# Altium footprint library lib.PcbLib: 145 footprints (part 2 of 10)
Each footprint in its own frame and in the unit in brackets; x right, y up, seen from the top. Pads: shape width x height; smd on the part's side, far side on the other; paste and mask are expansions set on the pad; w line width, h text height; cw(c..) or ccw(c..) is an arc to the next point about the centre after c.
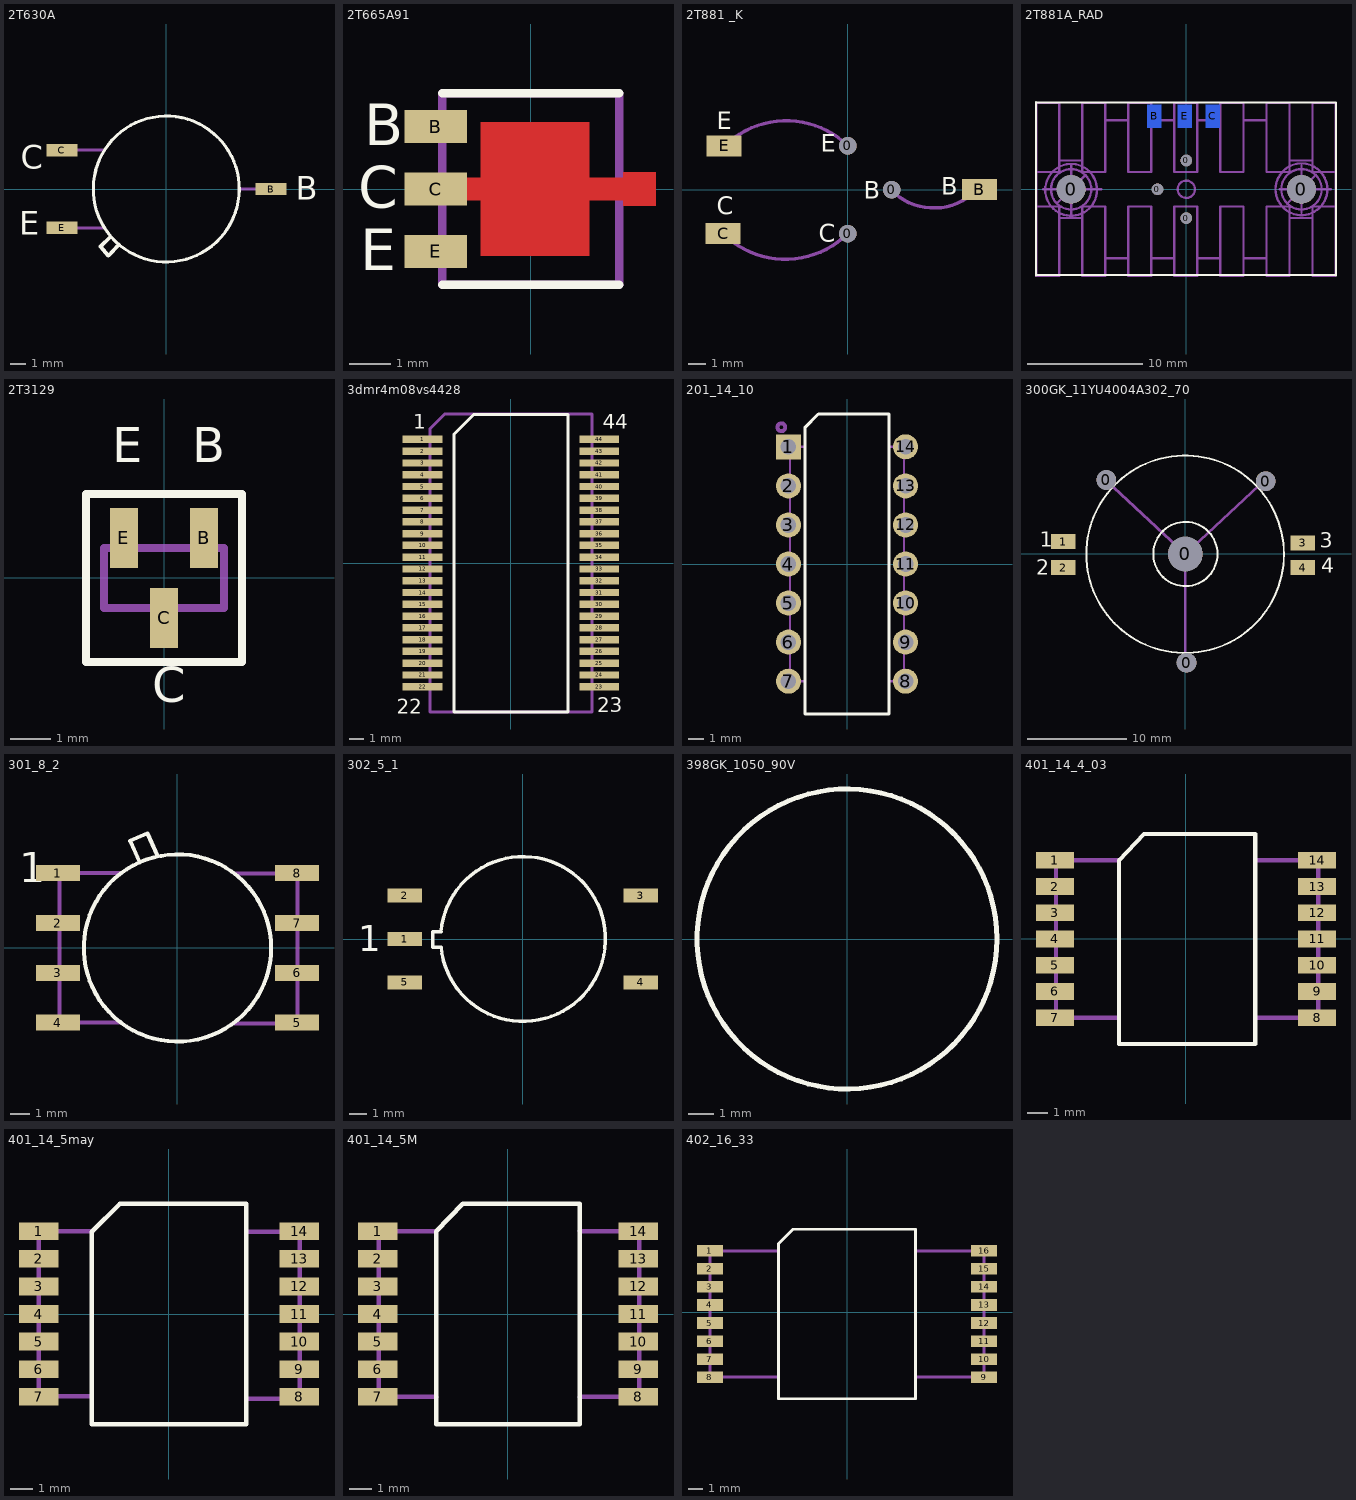
[diagram p1: the footprints below, top view; thin cyan lines are the x and y axes]

## 2T630A [mm]
height 9.6
pads (3):
  rect 2x0.8 smd: B(6.737,0) C(-6.737,2.5) E(-6.737,-2.5)
Top Overlay:
  lines w0.2: -3.586,-3.053 cw(c-0.012,0) -3.556,-3.087
  lines w0.254: -3.621,-3.103 -4.25,-3.7 -3.75,-4.3 -3.079,-3.596
  text "C" at -9.4,1.3 h1.5
  text "E" at -9.5,-2.95 h1.5
  text "B" at 8.325,-0.7 h1.5
Mechanical 5:
  lines w0.2: -7.25,-2.5 -4,-2.5 ; -7.25,2.5 -4,2.5 ; 4.75,0 7.25,0
Mechanical 25:
  text "B" at 5,1 h2
  text "C" at -5.25,3 h2
  text "E" at -5.5,-4.25 h2

## 2T665A91 [mm] "корпус 4601.3-1"
height 1.7
pads (3):
  rect 1.5x0.8 smd: B(-2.28,1.5) C(-2.28,0) E(-2.28,-1.5)
Top Layer:
  region: -1.2,-1.6 1.4,-1.6 1.4,1.6 -1.2,1.6
  region: 0.87,-0.275 2.22,-0.28 2.22,-0.4 3,-0.4 3,0.4 2.22,0.4 2.22,0.275 0.87,0.275
  region: -2.63,-0.275 -0.93,-0.275 -0.93,0.275 -2.63,0.275
Top Overlay:
  lines w0.2: -2.13,-2.3 2.12,-2.3 ; -2.13,2.3 2.12,2.3
  text "C" at -4.15,-0.45 h1
  text "B" at -4,1.05 h1
  text "E" at -4.1,-1.95 h1
Top Paste:
  region: -1.15,-1.55 1.35,-1.55 1.35,1.55 -1.15,1.55
  region: 0.87,-0.275 2.22,-0.28 2.225,-0.35 2.95,-0.35 2.95,0.35 2.225,0.35 2.22,0.275 0.87,0.275
  region: -2.575,-0.225 -0.95,-0.225 -0.95,0.225 -2.575,0.225
Top Solder:
  region: 0.35,-1.675 1.45,-1.675 1.45,-0.375 2.1,-0.375 2.1,-0.475 3.05,-0.475 3.05,0.475 2.1,0.475 2.1,0.375 1.45,0.375 1.45,1.675 -1.3,1.675 -1.3,0.375 -1.6,0.375 -1.6,0.325 -1.6,-0.375 -1.3,-0.375 -1.3,-1.675
Mechanical 5:
  lines w0.2: -2.13,-2.3 2.12,-2.3 2.12,2.3 -2.13,2.3 -2.13,-2.3
Mechanical 25:
  text "E" at -4.05,-2 h2
  text "B" at -4.1,1 h2
  text "C" at -4.25,-0.5 h2
3D body: height 0.44, standoff 0, extent 2.1,-0.4 2.7,0.4
3D body: height 0.44, standoff 0, extent -2.7,1.1 -2.1,1.9
3D body: height 0.44, standoff 0, extent -2.7,-0.4 -2.1,0.4
3D body: height 0.44, standoff 0, extent -2.7,-1.9 -2.1,-1.1
3D body: height 1.7, standoff 0, extent -2.1,-2.3 2.1,2.3

## 2T881 _K [mm]
height 7
pads (6):
  round 1 hole 1 unplated: 0(0,-2.5) 0(0,2.5) 0(2.5,0)
  rect 2x1.2 smd: B(7.5,0) C(-7.1,-2.5) E(-7.05,2.5)
Top Overlay:
  text "B" at 0.9,-0.525 h1
  text "C" at -1.65,-2.975 h1
  text "E" at -1.55,2.15 h1
  text "E" at -7.45,3.45 h1
  text "B" at 5.325,-0.3 h1
  text "C" at -7.475,-1.4 h1
Bottom Overlay:
  circle w0.2: c0,0 r4.7
  lines w0.2: -4.268,2.371 -5.056,3.081 -4.347,3.869 -3.558,3.159
Mechanical 5:
  circle w0.2: c2.5,0 r0.27
  circle w0.2: c0,-2.5 r0.27
  circle w0.2: c0,2.5 r0.27
  lines w0.2: -7.125,-2.475 ccw(c-3.55,1.075) 0,-2.5 ; -7.025,2.475 cw(c-3.5,-1.05) 0.025,2.475 ; 2.475,-0.025 ccw(c4.9,2.35) 7.275,-0.075
Mechanical 25:
  text "C" at -7.525,-1.7 h2
  text "B" at 5.35,-0.45 h2
  text "E" at -7.8,3.25 h2
3D body: height 0.8, standoff 0, extent -4.975,2.3 -3.5,3.8
3D body: height 0, standoff -7, extent -0.496,2.001 0.5,2.999
3D body: height 0, standoff -7, extent 2.004,-0.499 3,0.499
3D body: height 0, standoff -7, extent -0.496,-2.999 0.5,-2.001
3D body: height 6.3, standoff 0.8, extent -4,-3.997 4,3.997
3D body: height 0.7, standoff 0, extent -4.7,-4.697 4.7,4.697

## 2T881A_RAD [mm]
height 10
pads (8):
  round 2.5 hole 2.5 unplated: 0(-10,0) 0(10,0)
  round 1 hole 1 unplated: 0(-2.5,0) 0(0,-2.5) 0(0,2.5)
  rect 1.2x2 smd far side: B(-2.794,6.35) C(2.286,6.35) E(-0.127,6.35)
Top Overlay:
  lines w0.2: -13.05,-7.46 -13.05,7.54 ; -13.05,-7.45 13,-7.46 13,7.54 -13.05,7.55
Bottom Overlay:
  text "E" at 0.127,3.937 h1
  text "C" at 0.254,-4.445 h1
  text "B" at -2.413,1.016 h1
  text "B" at -3.988,5.716 h1
  text "C" at 4.404,5.705 h1
Top Solder:
  circle w1.5: c-10,0 r0.75
  circle w0.7: c-2.5,0 r0.25
  circle w1.5: c10,0 r0.75
  circle w0.7: c0,-2.5 r0.25
  circle w0.7: c0,2.5 r0.25
Bottom Solder:
  circle w1.5: c-10,0 r0.75
  circle w0.7: c-2.5,0 r0.25
  circle w1.5: c10,0 r0.75
  circle w0.7: c0,-2.5 r0.25
  circle w0.7: c0,2.5 r0.25
Mechanical 2:
  lines w0.2: -11.2,-1.2 -8.8,1.2 ; 8.75,-1.25 11.25,1.25
Mechanical 5:
  circle w0.2: c0,0 r0.75
  lines w0.2: -12.446,0 -7.366,0 ; -11.04,-2.5 -9.04,-2.5 ; -11.04,2.5 -9.04,2.5 ; -10,-2.159 -10,2.159 ; -7.04,-6 -5.04,-6 ; -7.04,6 -5.04,6 ; -3.04,-6 -1.04,-6 ; -3.04,6 -1.04,6 ; 0.96,-6 2.96,-6 ; 0.96,6 2.96,6 ; 4.96,-6 6.96,-6 ; 4.96,6 6.96,6 ; 8.128,0 12.573,0 ; 8.96,-2.5 10.96,-2.5 ; 8.96,2.5 10.96,2.5 ; 10,-2.032 10,2.032 ; -13.04,-1.5 -13.04,1.5 ; -13.04,-1.5 -11.04,-1.5 -11.04,-7.5 -13.04,-7.5 -13.04,-1.5 ; -13.04,1.5 -11.04,1.5 -11.04,7.5 -13.04,7.5 -13.04,1.5 ; 6.96,1.5 6.96,7.5 ; 6.96,1.5 6.96,7.5 ; 6.96,1.5 8.96,1.5 ; 6.96,1.5 8.96,1.5 ; 6.96,7.5 8.96,7.5 ; 6.96,7.5 8.96,7.5 ; 8.96,1.5 8.96,7.5 ; 8.96,1.5 8.96,7.5 ; 10.96,1.5 12.96,1.5 ; 10.96,1.5 12.96,1.5 ; 10.96,1.5 10.96,7.5 ; 10.96,1.5 10.96,7.5 ; 10.96,7.5 12.96,7.5 ; 10.96,7.5 12.96,7.5 ; 12.96,-1.5 10.96,-1.5 10.96,-7.5 12.96,-7.5 12.96,-1.5 ; 12.96,-1.5 12.96,1.5 ; 12.96,1.5 12.96,7.5 ; 12.96,1.5 12.96,7.5 ; -9.04,-7.5 -9.04,-1.5 -7.04,-1.5 -7.04,-7.5 -9.04,-7.5 ; -9.04,1.5 -9.04,7.5 -7.04,7.5 -7.04,1.5 -9.04,1.5 ; -5.04,-7.5 -3.04,-7.5 -3.04,-1.5 -5.04,-1.5 -5.04,-7.5 ; -5.04,1.5 -3.04,1.5 -3.04,7.5 -5.04,7.5 -5.04,1.5 ; -1.04,-7.5 -1.04,-1.5 0.96,-1.5 0.96,-7.5 -1.04,-7.5 ; -1.04,1.5 -1.04,7.5 0.96,7.5 0.96,1.5 -1.04,1.5 ; 2.96,-7.5 4.96,-7.5 4.96,-1.5 2.96,-1.5 2.96,-7.5 ; 2.96,1.5 4.96,1.5 4.96,7.5 2.96,7.5 2.96,1.5 ; 6.96,-7.5 6.96,-1.5 8.96,-1.5 8.96,-7.5 6.96,-7.5
Mechanical 6:
  circle w0.2: c-10,-0.05 r2.25
  circle w0.2: c-10,0 r1.75
  circle w0.2: c10,0 r2.25
  circle w0.2: c10,0 r1.75
3D body: height 10, standoff 0, extent -13,-7.5 13,7.5

## 2T3129 [mm] "М=0,01г, пластмассовый корпус, без прокладки,ручная пайка"
height 1.2
pads (3):
  rect 0.7x1.5 smd: B(1,1) C(0,-1) E(-1,1)
Top Overlay:
  lines w0.2: -1.95,-2.1 1.95,-2.1 1.95,2.1 -1.95,2.1 -1.95,-2.1
  text "B" at 0.7,2.6 h1.5
  text "E" at -1.3,2.6 h1.5
  text "C" at -0.3,-3.4 h1.5
Mechanical 5:
  lines w0.2: -1,0.75 -1,1.25 ; 0,-1.25 0,-0.75 ; 1,0.75 1,1.25 ; -1.5,-0.75 -1.5,0.75 1.5,0.75 1.5,-0.75 -1.5,-0.75
Mechanical 25:
  text "C" at -0.45,-2.925 h2
  text "E" at -1.325,2.15 h2
  text "B" at 0.7,2.15 h2
3D body "2t3130a.stp": height 1.2, standoff 0, extent -1.5,-1.25 1.5,1.25

## 3dmr4m08vs4428 [mm]
height 7.8
pads (44):
  rect 2.7x0.5 smd: 1(-6,8.4) 2(-6,7.6) 3(-6,6.8) 4(-6,6) 5(-6,5.2) 6(-6,4.4) 7(-6,3.6) 8(-6,2.8) 9(-6,2) 10(-6,1.2) 11(-6,0.4) 12(-6,-0.4) 13(-6,-1.2) 14(-6,-2) 15(-6,-2.8) 16(-6,-3.6) 17(-6,-4.4) 18(-6,-5.2) 19(-6,-6) 20(-6,-6.8) 21(-6,-7.6) 22(-6,-8.4) 23(6,-8.4) 24(6,-7.6) 25(6,-6.8) 26(6,-6) 27(6,-5.2) 28(6,-4.4) 29(6,-3.6) 30(6,-2.8) 31(6,-2) 32(6,-1.2) 33(6,-0.4) 34(6,0.4) 35(6,1.2) 36(6,2) 37(6,2.8) 38(6,3.6) 39(6,4.4) 40(6,5.2) 41(6,6) 42(6,6.8) 43(6,7.6) 44(6,8.4)
Top Overlay:
  lines w0.2: -3.875,-10.1 3.875,-10.1 3.875,10.1 -2.525,10.1 -3.875,8.75 -3.875,-10.1
  text "1" at -6.625,9.125 h1
  text "22" at -7.75,-10.25 h1
  text "23" at 5.875,-10.125 h1
  text "44" at 6.25,9.125 h1
Mechanical 5:
  lines w0.2: -5.5,-10.125 -5.5,9.125 -4.5,10.125 5.5,10.125 5.5,-10.125 -5.5,-10.125
3D body "3dmr4m08vs4428.stp": height 7.8, standoff -0.1, extent -6.9,-10.1 6.9,10.1

## 123abc [mm] "Шаблон"
Mechanical 5:
  text "Шаблон" at -2.5,-1.25 h2

## 201_14_10 [mm] "1401CA1MM"
height 5
pads (14):
  rect 1.6x1.6 hole 1: 1(-3.75,7.5)
  round 1.6 hole 1: 2(-3.75,5) 3(-3.75,2.5) 4(-3.75,0) 5(-3.75,-2.5) 6(-3.75,-5) 7(-3.75,-7.5) 8(3.75,-7.5) 9(3.75,-5) 10(3.75,-2.5) 11(3.75,0) 12(3.75,2.5) 13(3.75,5) 14(3.75,7.5)
Top Overlay:
  lines w0.2: -2.7,-9.6 -2.7,8.73 -1.83,9.6 2.7,9.6 2.7,-9.6 -2.7,-9.6
Mechanical 5:
  lines w0.15: -3.75,-7.5 -2.7,-7.5 ; -3.75,7.5 -2.7,7.5 ; -3.65,-7.7 -3.65,7.7 ; 2.7,-7.5 3.75,-7.5 ; 2.8,7.5 3.75,7.5 ; 3.65,-7.7 3.65,7.7
Mechanical 25:
  circle w0.25: c-4.2,8.75 r0.25
  text "14" at 1.143,6.985 h2
  text "1" at -2.667,7.112 h2
  text "8" at 1.905,-7.874 h2
  text "7" at -2.286,-8.001 h2
3D body: height 5, standoff 1.3, extent -3.625,-9.625 3.625,9.625
3D body: height 2, standoff -2, extent 3.625,-8 3.875,-7
3D body: height 2, standoff -2, extent 3.625,-5.5 3.875,-4.5
3D body: height 2, standoff -2, extent 3.625,-3 3.875,-2
3D body: height 2, standoff -2, extent 3.625,4.5 3.875,5.5
3D body: height 2, standoff -2, extent 3.625,2 3.875,3
3D body: height 2, standoff -2, extent 3.625,-0.5 3.875,0.5
3D body: height 2, standoff -2, extent 3.625,7 3.875,8
3D body: height 2, standoff -2, extent -3.875,7 -3.625,8
3D body: height 2, standoff -2, extent -3.875,-0.5 -3.625,0.5
3D body: height 2, standoff -2, extent -3.875,2 -3.625,3
3D body: height 2, standoff -2, extent -3.875,4.5 -3.625,5.5
3D body: height 2, standoff -2, extent -3.875,-3 -3.625,-2
3D body: height 2, standoff -2, extent -3.875,-5.5 -3.625,-4.5
3D body: height 2, standoff -2, extent -3.875,-8 -3.625,-7

## 300GK_11YU4004A302_70 [mm] "6g"
height 8.5
pads (8):
  round 2 hole 2 unplated: 0(-8,7.5) 0(0.125,-11) 0(8.125,7.375)
  round 3.5 hole 3.5 unplated: 0(0,0)
  rect 2.5x1.5 smd: 1(-12.375,1.25) 2(-12.375,-1.375) 3(11.875,1.125) 4(11.875,-1.375)
Top Overlay:
  circle w0.2: c-0.025,-0.025 r10
  circle w0.2: c0,0 r3.25
  text "1" at -14.75,0.75 h1.5
  text "2" at -15.125,-2.125 h1.5
  text "3" at 13.625,0.625 h1.5
  text "4" at 13.75,-1.875 h1.5
Mechanical 5:
  lines w0.25: -8.044,7.453 -0.03,-0.019 ; -0.025,-11.15 -0.025,-0.025 ; -0.019,-0.03 8.235,7.665
Mechanical 6:
  lines w0.25: -7.979,7.439 0,0 ; 0,-11 0,0 ; 8.186,7.633 0,0
Mechanical 25:
  text "4" at 13.875,-2.375 h2
  text "3" at 14.125,0.5 h2
  text "2" at -15,-2.375 h2
  text "1" at -14.75,0.875 h2

## 301_8_2 [mm] "m0.25g(для 512СА3 h7.6mm)"
height 9.7
pads (8):
  rect 2.2x0.8 smd: 1(-6,3.75) 2(-6,1.25) 3(-6,-1.25) 4(-6,-3.75) 5(6,-3.75) 6(6,-1.25) 7(6,1.25) 8(6,3.75)
Top Overlay:
  circle w0.2: c0,0 r4.7
  lines w0.2: -1.898,4.301 -2.375,5.375 -1.5,5.75 -1,4.625
  text "1" at -7.95,3.3 h1.5
Mechanical 5:
  lines w0.2: -2.9,-3.75 -5.925,-3.75 -5.925,3.75 -2.825,3.75 ; 2.8,-3.8 5.9,-3.8 6.025,-3.675 6.025,3.725 2.925,3.725
Mechanical 25:
  text "1" at -4.275,3.25 h2
  text "2" at -4.325,0.65 h2
  text "3" at -4.325,-1.9 h2
  text "4" at -4.4,-4.5 h2
  text "8" at 3.6,3.125 h2
  text "7" at 3.725,0.475 h2
  text "6" at 3.6,-1.925 h2
  text "5" at 3.525,-4.425 h2

## 302_5_1 [mm] "30Т123А-Г,     30Т126А,Б,      302.5-7"
height 11.6
pads (5):
  rect 2x0.8 smd: 1(-6.8,0) 2(-6.8,2.5) 3(6.8,2.5) 4(6.8,-2.5) 5(-6.8,-2.5)
Top Overlay:
  lines w0.2: -4.706,0.428 cw(c0.025,0) -4.701,-0.478 ; -4.675,-0.475 -5.175,-0.475 -5.175,0.425 -4.675,0.425
  text "1" at -9.487,-0.713 h1.5
Mechanical 25:
  text "5" at -5.375,-3.175 h2
  text "4" at 4.425,-3.125 h2
  text "3" at 4.575,2.125 h2
  text "2" at -5.7,1.775 h2
  text "1" at -5.725,-0.675 h2

## 398GK_1050_90V [mm]
height 6.5
Top Overlay:
  circle w0.2: c0,0 r6
3D body: height 6.5, standoff 0, extent -6,-6 6,6

## 401_14_4_03 [mm]
pads (14):
  rect 1.8x0.8 smd: 1(-6.25,3.75) 2(-6.25,2.5) 3(-6.25,1.25) 4(-6.25,0) 5(-6.25,-1.25) 6(-6.25,-2.5) 7(-6.25,-3.75) 8(6.25,-3.75) 9(6.25,-2.5) 10(6.25,-1.25) 11(6.25,0) 12(6.25,1.25) 13(6.25,2.5) 14(6.25,3.75)
Top Overlay:
  lines w0.2: -3.2,-5 -3.2,3.75 -2,5 1.05,5 3.3,5 3.3,-5 -3.2,-5
Mechanical 5:
  lines w0.2: -3.2,-3.75 -6.2,-3.75 -6.2,3.75 -3.2,3.75 ; 3.3,-3.75 6.3,-3.75 6.3,3.75 3.3,3.75
Mechanical 25:
  text "1" at -4.75,3.25 h2
  text "7" at -4.925,-4.2 h2
  text "8" at 4.425,-4.225 h2
  text "14" at 3.65,3.275 h2

## 401_14_5may [mm] "14_125"
height 2
pads (14):
  rect 1.8x0.8 smd: 1(-5.9,3.75) 2(-5.9,2.5) 3(-5.9,1.25) 4(-5.9,0) 5(-5.9,-1.25) 6(-5.9,-2.5) 7(-5.9,-3.75) 8(5.9,-3.75) 9(5.9,-2.5) 10(5.9,-1.25) 11(5.9,0) 12(5.9,1.25) 13(5.9,2.5) 14(5.9,3.75)
Top Overlay:
  lines w0.2: -3.5,-5 -3.5,3.725 -2.225,5 3.5,5 3.5,-5 -3.5,-5
Mechanical 5:
  lines w0.2: -3.525,-3.725 -5.9,-3.725 -5.9,3.75 -3.5,3.75 -3.475,3.725 ; 3.5,-3.85 5.9,-3.85 5.925,-3.825 5.925,3.7 5.95,3.725 3.5,3.725
3D body "CFP125P1240X200-14N.step": height 2, standoff 0, extent -6.25,-5 6.25,5

## 401_14_5М [mm] "44.3209.125.08(1564ТЛ2)"
height 1.9
pads (14):
  rect 1.8x0.8 smd: 1(-5.9,3.75) 2(-5.9,2.5) 3(-5.9,1.25) 4(-5.9,0) 5(-5.9,-1.25) 6(-5.9,-2.5) 7(-5.9,-3.75) 8(5.9,-3.75) 9(5.9,-2.5) 10(5.9,-1.25) 11(5.9,0) 12(5.9,1.25) 13(5.9,2.5) 14(5.9,3.75)
Top Overlay:
  lines w0.2: -3.25,-5 3.25,-5 3.25,5 1,5 -2.05,5 -3.25,3.75 -3.25,-5
Mechanical 5:
  lines w0.2: -3.25,-3.75 -5.85,-3.75 -5.85,3.75 -3.25,3.75 ; 3.25,-3.75 5.95,-3.75 5.95,3.75 3.25,3.75
Mechanical 25:
  text "14" at 3.075,3.175 h2
  text "8" at 3.9,-4.325 h2
  text "7" at -4.625,-4.275 h2
  text "1" at -4.275,3.1 h2
3D body "CFP125P1240X200-14N.step": height 2, standoff 0, extent -6.25,-5 6.25,5

## 402_16_33 [mm] "m2g"
height 2.5
pads (16):
  rect 1.8x0.8 smd: 1(-9.5,4.25) 2(-9.5,3) 3(-9.5,1.75) 4(-9.5,0.5) 5(-9.5,-0.75) 6(-9.5,-2) 7(-9.5,-3.25) 8(-9.5,-4.5) 9(9.5,-4.5) 10(9.5,-3.25) 11(9.5,-2) 12(9.5,-0.75) 13(9.5,0.5) 14(9.5,1.75) 15(9.5,3) 16(9.5,4.25)
Top Overlay:
  lines w0.2: -4.75,-6 4.75,-6 4.75,5.75 -3.75,5.75 -4.75,4.75 -4.75,-6
Mechanical 5:
  lines w0.2: -4.75,-4.5 -9.5,-4.5 -9.5,4.25 -4.75,4.25 ; 4.75,-4.5 9.5,-4.5 9.5,4.25 4.75,4.25
Mechanical 25:
  text "1" at -8.05,3.7 h2
  text "8" at -8.15,-5.125 h2
  text "9" at 7.525,-5.125 h2
  text "16" at 6.7,3.5 h2
3D body "402_16_23.stp": height 3.1, standoff 0, extent -9.65,-5.75 9.65,5.75